# Altium footprint library Package_DFN_QFN.PcbLib: 557 footprints (part 33 of 35)
Each footprint in its own frame and in the unit in brackets; x right, y up, seen from the top. Pads: shape width x height; smd on the part's side, far side on the other; paste and mask are expansions set on the pad; w line width, h text height; cw(c..) or ccw(c..) is an arc to the next point about the centre after c.
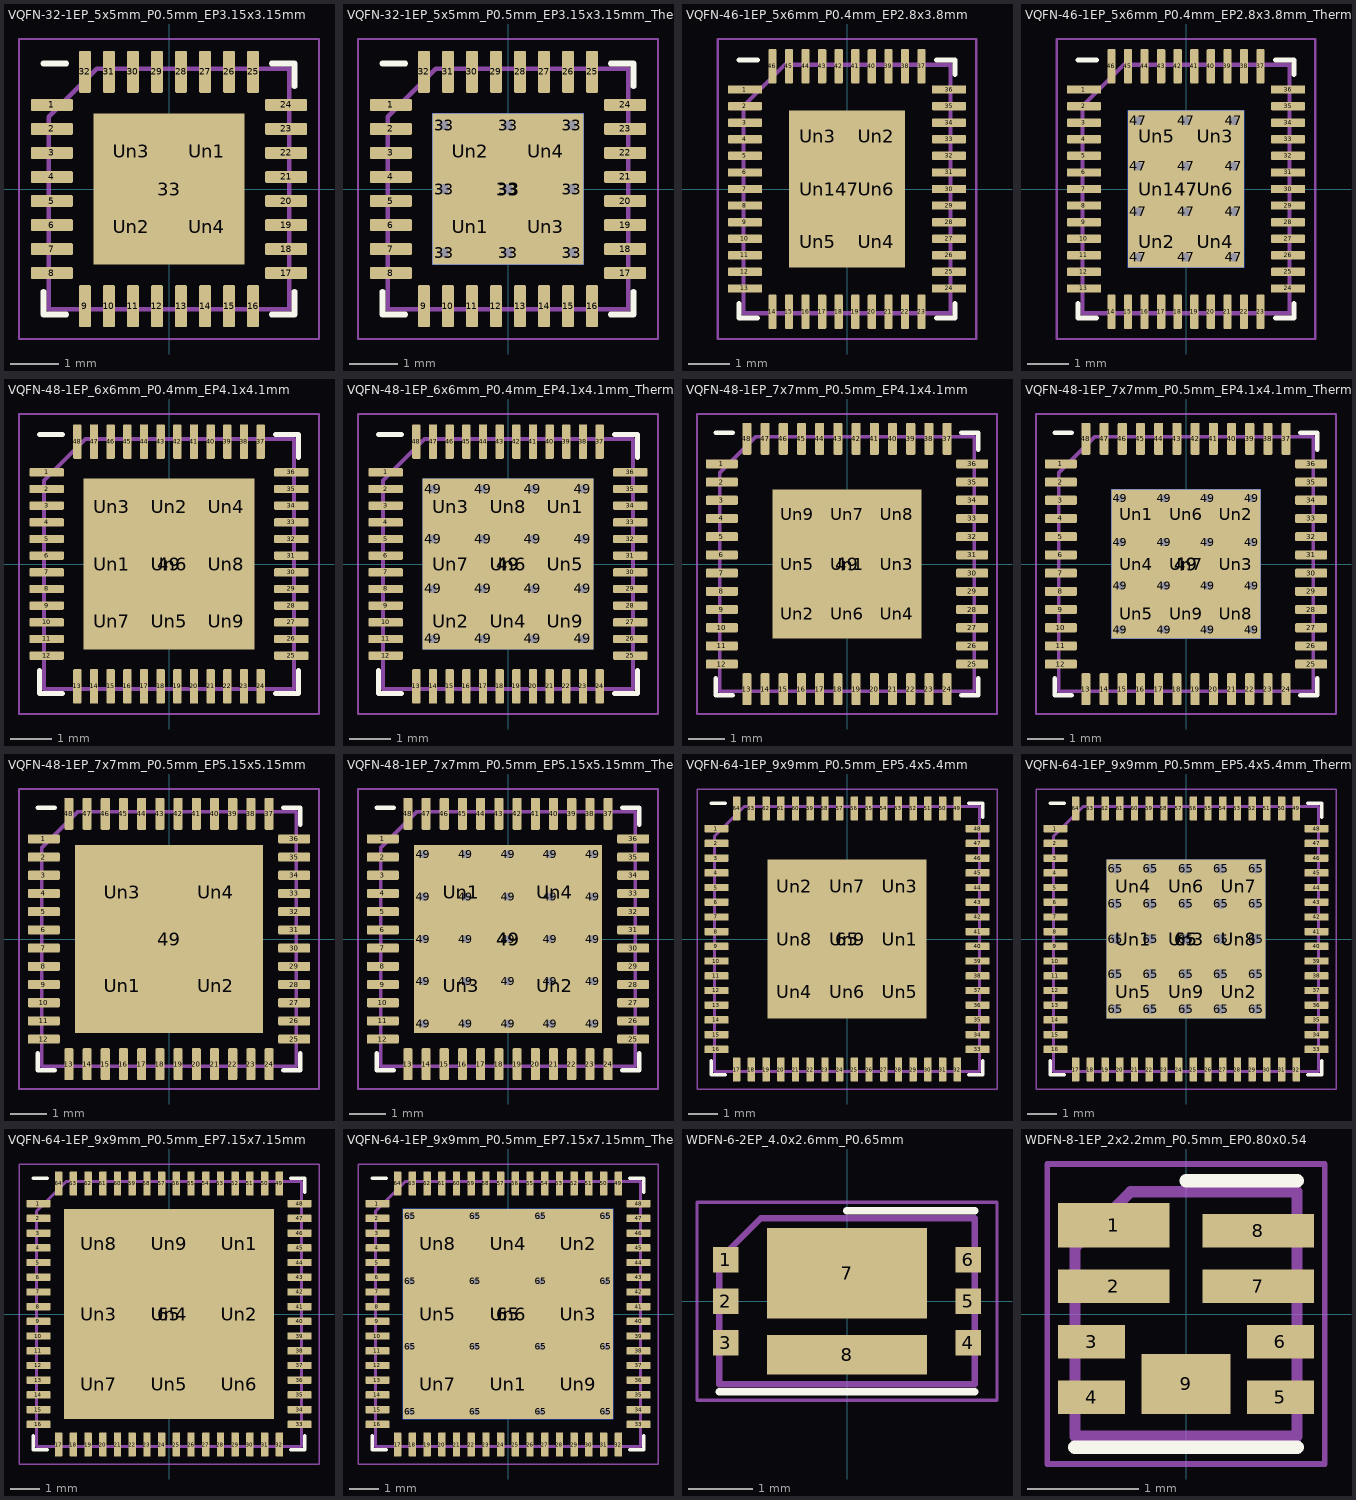
[diagram p32: the footprints below, top view; thin cyan lines are the x and y axes]

## VQFN-32-1EP_5x5mm_P0.5mm_EP3.15x3.15mm [mm]
pads (37):
  rrect25% 0.875x0.25 smd: 1(-2.438,1.75) 2(-2.438,1.25) 3(-2.438,0.75) 4(-2.438,0.25) 5(-2.438,-0.25) 6(-2.438,-0.75) 7(-2.438,-1.25) 8(-2.438,-1.75) 17(2.438,-1.75) 18(2.438,-1.25) 19(2.438,-0.75) 20(2.438,-0.25) 21(2.438,0.25) 22(2.438,0.75) 23(2.438,1.25) 24(2.438,1.75)
  rrect25% 0.25x0.875 smd: 9(-1.75,-2.438) 10(-1.25,-2.438) 11(-0.75,-2.438) 12(-0.25,-2.438) 13(0.25,-2.438) 14(0.75,-2.438) 15(1.25,-2.438) 16(1.75,-2.438) 25(1.75,2.438) 26(1.25,2.438) 27(0.75,2.438) 28(0.25,2.438) 29(-0.25,2.438) 30(-0.75,2.438) 31(-1.25,2.438) 32(-1.75,2.438)
  rect 3.15x3.15 smd: 33(0,0)
  rrect20% 1.27x1.27 on Top Paste: Un1(0.79,0.79) Un2(-0.79,-0.79) Un3(-0.79,0.79) Un4(0.79,-0.79)
F.SilkS:
  lines w0.12: -2.61,-2.135 -2.61,-2.61 -2.135,-2.61 ; -2.61,2.61 -2.135,2.61 ; 2.135,-2.61 2.61,-2.61 2.61,-2.135 ; 2.135,2.61 2.61,2.61 2.61,2.135
F.CrtYd:
  lines w0.05: -3.12,-3.12 -3.12,3.12 3.12,3.12 3.12,-3.12 -3.12,-3.12
F.Fab:
  lines w0.1: -2.5,-2.5 -2.5,1.5 -1.5,2.5 2.5,2.5 2.5,-2.5 -2.5,-2.5
  text "'.Designator'" at -4.047,-0.84 h1

## VQFN-32-1EP_5x5mm_P0.5mm_EP3.15x3.15mm_ThermalVias [mm]
pads (47):
  rrect25% 0.875x0.25 smd: 1(-2.438,1.75) 2(-2.438,1.25) 3(-2.438,0.75) 4(-2.438,0.25) 5(-2.438,-0.25) 6(-2.438,-0.75) 7(-2.438,-1.25) 8(-2.438,-1.75) 17(2.438,-1.75) 18(2.438,-1.25) 19(2.438,-0.75) 20(2.438,-0.25) 21(2.438,0.25) 22(2.438,0.75) 23(2.438,1.25) 24(2.438,1.75)
  rrect25% 0.25x0.875 smd: 9(-1.75,-2.438) 10(-1.25,-2.438) 11(-0.75,-2.438) 12(-0.25,-2.438) 13(0.25,-2.438) 14(0.75,-2.438) 15(1.25,-2.438) 16(1.75,-2.438) 25(1.75,2.438) 26(1.25,2.438) 27(0.75,2.438) 28(0.25,2.438) 29(-0.25,2.438) 30(-0.75,2.438) 31(-1.25,2.438) 32(-1.75,2.438)
  round 0.5 hole 0.2: 33(-1.325,-1.325) 33(-1.325,0) 33(-1.325,1.325) 33(0,-1.325) 33(0,0) 33(0,1.325) 33(1.325,-1.325) 33(1.325,0) 33(1.325,1.325)
  rect 3.15x3.15 smd far side: 33(0,0)
  rect 3.15x3.15 smd: 33(0,0)
  rrect20% 1.27x1.27 on Top Paste: Un1(-0.79,-0.79) Un2(-0.79,0.79) Un3(0.79,-0.79) Un4(0.79,0.79)
F.SilkS:
  lines w0.12: -2.61,-2.135 -2.61,-2.61 -2.135,-2.61 ; -2.61,2.61 -2.135,2.61 ; 2.135,-2.61 2.61,-2.61 2.61,-2.135 ; 2.135,2.61 2.61,2.61 2.61,2.135
F.CrtYd:
  lines w0.05: -3.12,-3.12 3.12,-3.12 3.12,3.12 -3.12,3.12 -3.12,-3.12
F.Fab:
  lines w0.1: -2.5,-2.5 -2.5,1.5 -1.5,2.5 2.5,2.5 2.5,-2.5 -2.5,-2.5
  text "'.Designator'" at -4.047,-0.84 h1

## VQFN-46-1EP_5x6mm_P0.4mm_EP2.8x3.8mm [mm]
pads (53):
  rrect25% 0.825x0.2 smd: 1(-2.462,2.4) 2(-2.462,2) 3(-2.462,1.6) 4(-2.462,1.2) 5(-2.462,0.8) 6(-2.462,0.4) 7(-2.462,0) 8(-2.462,-0.4) 9(-2.462,-0.8) 10(-2.462,-1.2) 11(-2.462,-1.6) 12(-2.462,-2) 13(-2.462,-2.4) 24(2.462,-2.4) 25(2.462,-2) 26(2.462,-1.6) 27(2.462,-1.2) 28(2.462,-0.8) 29(2.462,-0.4) 30(2.462,0) 31(2.462,0.4) 32(2.462,0.8) 33(2.462,1.2) 34(2.462,1.6) 35(2.462,2) 36(2.462,2.4)
  rrect25% 0.2x0.825 smd: 14(-1.8,-2.963) 15(-1.4,-2.963) 16(-1,-2.963) 17(-0.6,-2.963) 18(-0.2,-2.963) 19(0.2,-2.963) 20(0.6,-2.963) 21(1,-2.963) 22(1.4,-2.963) 23(1.8,-2.963) 37(1.8,2.963) 38(1.4,2.963) 39(1,2.963) 40(0.6,2.963) 41(0.2,2.963) 42(-0.2,2.963) 43(-0.6,2.963) 44(-1,2.963) 45(-1.4,2.963) 46(-1.8,2.963)
  rect 2.8x3.8 smd: 47(0,0)
  rrect25% 1.13x1.02 on Top Paste: Un1(-0.7,0) Un2(0.7,1.27) Un3(-0.7,1.27) Un4(0.7,-1.27) Un5(-0.7,-1.27) Un6(0.7,0)
F.SilkS:
  lines w0.12: -2.61,-2.76 -2.61,-3.11 -2.16,-3.11 ; -2.61,3.11 -2.16,3.11 ; 2.16,-3.11 2.61,-3.11 2.61,-2.76 ; 2.16,3.11 2.61,3.11 2.61,2.76
F.CrtYd:
  lines w0.05: -3.12,-3.62 3.12,-3.62 3.12,3.62 -3.12,3.62 -3.12,-3.62
F.Fab:
  lines w0.1: -2.5,-3 2.5,-3 2.5,3 -1.5,3 -2.5,2 -2.5,-3
  text "'.Designator'" at -4.047,-0.84 h1

## VQFN-46-1EP_5x6mm_P0.4mm_EP2.8x3.8mm_ThermalVias [mm]
pads (66):
  rrect25% 0.825x0.2 smd: 1(-2.462,2.4) 2(-2.462,2) 3(-2.462,1.6) 4(-2.462,1.2) 5(-2.462,0.8) 6(-2.462,0.4) 7(-2.462,0) 8(-2.462,-0.4) 9(-2.462,-0.8) 10(-2.462,-1.2) 11(-2.462,-1.6) 12(-2.462,-2) 13(-2.462,-2.4) 24(2.462,-2.4) 25(2.462,-2) 26(2.462,-1.6) 27(2.462,-1.2) 28(2.462,-0.8) 29(2.462,-0.4) 30(2.462,0) 31(2.462,0.4) 32(2.462,0.8) 33(2.462,1.2) 34(2.462,1.6) 35(2.462,2) 36(2.462,2.4)
  rrect25% 0.2x0.825 smd: 14(-1.8,-2.963) 15(-1.4,-2.963) 16(-1,-2.963) 17(-0.6,-2.963) 18(-0.2,-2.963) 19(0.2,-2.963) 20(0.6,-2.963) 21(1,-2.963) 22(1.4,-2.963) 23(1.8,-2.963) 37(1.8,2.963) 38(1.4,2.963) 39(1,2.963) 40(0.6,2.963) 41(0.2,2.963) 42(-0.2,2.963) 43(-0.6,2.963) 44(-1,2.963) 45(-1.4,2.963) 46(-1.8,2.963)
  round 0.5 hole 0.2: 47(-1.15,-1.65) 47(-1.15,-0.55) 47(-1.15,0.55) 47(-1.15,1.65) 47(0,-1.65) 47(0,-0.55) 47(0,0.55) 47(0,1.65) 47(1.15,-1.65) 47(1.15,-0.55) 47(1.15,0.55) 47(1.15,1.65)
  rect 2.8x3.8 smd: 47(0,0)
  rect 2.8x3.8 smd far side: 47(0,0)
  rrect23% 1.21x1.1 on Top Paste: Un1(-0.7,0) Un2(-0.7,-1.27) Un3(0.7,1.27) Un4(0.7,-1.27) Un5(-0.7,1.27) Un6(0.7,0)
F.SilkS:
  lines w0.12: -2.61,-2.76 -2.61,-3.11 -2.16,-3.11 ; -2.61,3.11 -2.16,3.11 ; 2.16,-3.11 2.61,-3.11 2.61,-2.76 ; 2.16,3.11 2.61,3.11 2.61,2.76
F.CrtYd:
  lines w0.05: -3.12,-3.62 3.12,-3.62 3.12,3.62 -3.12,3.62 -3.12,-3.62
F.Fab:
  lines w0.1: -2.5,-3 2.5,-3 2.5,3 -1.5,3 -2.5,2 -2.5,-3
  text "'.Designator'" at -4.047,-0.84 h1

## VQFN-48-1EP_6x6mm_P0.4mm_EP4.1x4.1mm [mm]
pads (58):
  rrect25% 0.825x0.2 smd: 1(-2.937,2.2) 2(-2.937,1.8) 3(-2.937,1.4) 4(-2.937,1) 5(-2.937,0.6) 6(-2.937,0.2) 7(-2.937,-0.2) 8(-2.937,-0.6) 9(-2.937,-1) 10(-2.937,-1.4) 11(-2.937,-1.8) 12(-2.937,-2.2) 25(2.937,-2.2) 26(2.937,-1.8) 27(2.937,-1.4) 28(2.937,-1) 29(2.937,-0.6) 30(2.937,-0.2) 31(2.937,0.2) 32(2.937,0.6) 33(2.937,1) 34(2.937,1.4) 35(2.937,1.8) 36(2.937,2.2)
  rrect25% 0.2x0.825 smd: 13(-2.2,-2.937) 14(-1.8,-2.937) 15(-1.4,-2.937) 16(-1,-2.937) 17(-0.6,-2.937) 18(-0.2,-2.937) 19(0.2,-2.937) 20(0.6,-2.937) 21(1,-2.937) 22(1.4,-2.937) 23(1.8,-2.937) 24(2.2,-2.937) 37(2.2,2.937) 38(1.8,2.937) 39(1.4,2.937) 40(1,2.937) 41(0.6,2.937) 42(0.2,2.937) 43(-0.2,2.937) 44(-0.6,2.937) 45(-1,2.937) 46(-1.4,2.937) 47(-1.8,2.937) 48(-2.2,2.937)
  rect 4.1x4.1 smd: 49(0,0)
  rrect23% 1.1x1.1 on Top Paste: Un1(-1.37,0) Un2(0,1.37) Un3(-1.37,1.37) Un4(1.37,1.37) Un5(0,-1.37) Un6(0,0) Un7(-1.37,-1.37) Un8(1.37,0) Un9(1.37,-1.37)
F.SilkS:
  lines w0.12: -3.11,-2.56 -3.11,-3.11 -2.56,-3.11 ; -3.11,3.11 -2.56,3.11 ; 2.56,-3.11 3.11,-3.11 3.11,-2.56 ; 2.56,3.11 3.11,3.11 3.11,2.56
F.CrtYd:
  lines w0.05: -3.6,-3.6 -3.6,3.6 3.6,3.6 3.6,-3.6 -3.6,-3.6
F.Fab:
  lines w0.1: -3,-3 3,-3 3,3 -2,3 -3,2 -3,-3
  text "'.Designator'" at -4.047,-0.84 h1

## VQFN-48-1EP_6x6mm_P0.4mm_EP4.1x4.1mm_ThermalVias [mm]
pads (75):
  rrect25% 0.825x0.2 smd: 1(-2.937,2.2) 2(-2.937,1.8) 3(-2.937,1.4) 4(-2.937,1) 5(-2.937,0.6) 6(-2.937,0.2) 7(-2.937,-0.2) 8(-2.937,-0.6) 9(-2.937,-1) 10(-2.937,-1.4) 11(-2.937,-1.8) 12(-2.937,-2.2) 25(2.937,-2.2) 26(2.937,-1.8) 27(2.937,-1.4) 28(2.937,-1) 29(2.937,-0.6) 30(2.937,-0.2) 31(2.937,0.2) 32(2.937,0.6) 33(2.937,1) 34(2.937,1.4) 35(2.937,1.8) 36(2.937,2.2)
  rrect25% 0.2x0.825 smd: 13(-2.2,-2.937) 14(-1.8,-2.937) 15(-1.4,-2.937) 16(-1,-2.937) 17(-0.6,-2.937) 18(-0.2,-2.937) 19(0.2,-2.937) 20(0.6,-2.937) 21(1,-2.937) 22(1.4,-2.937) 23(1.8,-2.937) 24(2.2,-2.937) 37(2.2,2.937) 38(1.8,2.937) 39(1.4,2.937) 40(1,2.937) 41(0.6,2.937) 42(0.2,2.937) 43(-0.2,2.937) 44(-0.6,2.937) 45(-1,2.937) 46(-1.4,2.937) 47(-1.8,2.937) 48(-2.2,2.937)
  round 0.5 hole 0.2: 49(-1.8,-1.8) 49(-1.8,-0.6) 49(-1.8,0.6) 49(-1.8,1.8) 49(-0.6,-1.8) 49(-0.6,-0.6) 49(-0.6,0.6) 49(-0.6,1.8) 49(0.6,-1.8) 49(0.6,-0.6) 49(0.6,0.6) 49(0.6,1.8) 49(1.8,-1.8) 49(1.8,-0.6) 49(1.8,0.6) 49(1.8,1.8)
  rect 4.1x4.1 smd: 49(0,0)
  rect 4.1x4.1 smd far side: 49(0,0)
  rrect23% 1.1x1.1 on Top Paste: Un1(1.37,1.37) Un2(-1.37,-1.37) Un3(-1.37,1.37) Un4(0,-1.37) Un5(1.37,0) Un6(0,0) Un7(-1.37,0) Un8(0,1.37) Un9(1.37,-1.37)
F.SilkS:
  lines w0.12: -3.11,-2.56 -3.11,-3.11 -2.56,-3.11 ; -3.11,3.11 -2.56,3.11 ; 2.56,-3.11 3.11,-3.11 3.11,-2.56 ; 2.56,3.11 3.11,3.11 3.11,2.56
F.CrtYd:
  lines w0.05: -3.6,-3.6 -3.6,3.6 3.6,3.6 3.6,-3.6 -3.6,-3.6
F.Fab:
  lines w0.1: -3,-3 3,-3 3,3 -2,3 -3,2 -3,-3
  text "'.Designator'" at -4.047,-0.84 h1

## VQFN-48-1EP_7x7mm_P0.5mm_EP4.1x4.1mm [mm]
pads (58):
  rrect25% 0.875x0.25 smd: 1(-3.437,2.75) 2(-3.437,2.25) 3(-3.437,1.75) 4(-3.437,1.25) 5(-3.437,0.75) 6(-3.437,0.25) 7(-3.437,-0.25) 8(-3.437,-0.75) 9(-3.437,-1.25) 10(-3.437,-1.75) 11(-3.437,-2.25) 12(-3.437,-2.75) 25(3.437,-2.75) 26(3.437,-2.25) 27(3.437,-1.75) 28(3.437,-1.25) 29(3.437,-0.75) 30(3.437,-0.25) 31(3.437,0.25) 32(3.437,0.75) 33(3.437,1.25) 34(3.437,1.75) 35(3.437,2.25) 36(3.437,2.75)
  rrect25% 0.25x0.875 smd: 13(-2.75,-3.437) 14(-2.25,-3.437) 15(-1.75,-3.437) 16(-1.25,-3.437) 17(-0.75,-3.437) 18(-0.25,-3.437) 19(0.25,-3.437) 20(0.75,-3.437) 21(1.25,-3.437) 22(1.75,-3.437) 23(2.25,-3.437) 24(2.75,-3.437) 37(2.75,3.437) 38(2.25,3.437) 39(1.75,3.437) 40(1.25,3.437) 41(0.75,3.437) 42(0.25,3.437) 43(-0.25,3.437) 44(-0.75,3.437) 45(-1.25,3.437) 46(-1.75,3.437) 47(-2.25,3.437) 48(-2.75,3.437)
  rect 4.1x4.1 smd: 49(0,0)
  rrect23% 1.1x1.1 on Top Paste: Un1(0,0) Un2(-1.37,-1.37) Un3(1.37,0) Un4(1.37,-1.37) Un5(-1.37,0) Un6(0,-1.37) Un7(0,1.37) Un8(1.37,1.37) Un9(-1.37,1.37)
F.SilkS:
  lines w0.12: -3.61,-3.135 -3.61,-3.61 -3.135,-3.61 ; -3.61,3.61 -3.135,3.61 ; 3.135,-3.61 3.61,-3.61 3.61,-3.135 ; 3.135,3.61 3.61,3.61 3.61,3.135
F.CrtYd:
  lines w0.05: -4.12,-4.12 -4.12,4.12 4.12,4.12 4.12,-4.12 -4.12,-4.12
F.Fab:
  lines w0.1: -3.5,-3.5 -3.5,2.5 -2.5,3.5 3.5,3.5 3.5,-3.5 -3.5,-3.5
  text "'.Designator'" at -4.047,-0.84 h1

## VQFN-48-1EP_7x7mm_P0.5mm_EP4.1x4.1mm_ThermalVias [mm]
pads (75):
  rrect25% 0.875x0.25 smd: 1(-3.437,2.75) 2(-3.437,2.25) 3(-3.437,1.75) 4(-3.437,1.25) 5(-3.437,0.75) 6(-3.437,0.25) 7(-3.437,-0.25) 8(-3.437,-0.75) 9(-3.437,-1.25) 10(-3.437,-1.75) 11(-3.437,-2.25) 12(-3.437,-2.75) 25(3.437,-2.75) 26(3.437,-2.25) 27(3.437,-1.75) 28(3.437,-1.25) 29(3.437,-0.75) 30(3.437,-0.25) 31(3.437,0.25) 32(3.437,0.75) 33(3.437,1.25) 34(3.437,1.75) 35(3.437,2.25) 36(3.437,2.75)
  rrect25% 0.25x0.875 smd: 13(-2.75,-3.437) 14(-2.25,-3.437) 15(-1.75,-3.437) 16(-1.25,-3.437) 17(-0.75,-3.437) 18(-0.25,-3.437) 19(0.25,-3.437) 20(0.75,-3.437) 21(1.25,-3.437) 22(1.75,-3.437) 23(2.25,-3.437) 24(2.75,-3.437) 37(2.75,3.437) 38(2.25,3.437) 39(1.75,3.437) 40(1.25,3.437) 41(0.75,3.437) 42(0.25,3.437) 43(-0.25,3.437) 44(-0.75,3.437) 45(-1.25,3.437) 46(-1.75,3.437) 47(-2.25,3.437) 48(-2.75,3.437)
  round 0.5 hole 0.2: 49(-1.8,-1.8) 49(-1.8,-0.6) 49(-1.8,0.6) 49(-1.8,1.8) 49(-0.6,-1.8) 49(-0.6,-0.6) 49(-0.6,0.6) 49(-0.6,1.8) 49(0.6,-1.8) 49(0.6,-0.6) 49(0.6,0.6) 49(0.6,1.8) 49(1.8,-1.8) 49(1.8,-0.6) 49(1.8,0.6) 49(1.8,1.8)
  rect 4.1x4.1 smd: 49(0,0)
  rect 4.1x4.1 smd far side: 49(0,0)
  rrect23% 1.1x1.1 on Top Paste: Un1(-1.37,1.37) Un2(1.37,1.37) Un3(1.37,0) Un4(-1.37,0) Un5(-1.37,-1.37) Un6(0,1.37) Un7(0,0) Un8(1.37,-1.37) Un9(0,-1.37)
F.SilkS:
  lines w0.12: -3.61,-3.135 -3.61,-3.61 -3.135,-3.61 ; -3.61,3.61 -3.135,3.61 ; 3.135,-3.61 3.61,-3.61 3.61,-3.135 ; 3.135,3.61 3.61,3.61 3.61,3.135
F.CrtYd:
  lines w0.05: -4.12,-4.12 4.12,-4.12 4.12,4.12 -4.12,4.12 -4.12,-4.12
F.Fab:
  lines w0.1: -3.5,-3.5 3.5,-3.5 3.5,3.5 -2.5,3.5 -3.5,2.5 -3.5,-3.5
  text "'.Designator'" at -4.047,-0.84 h1

## VQFN-48-1EP_7x7mm_P0.5mm_EP5.15x5.15mm [mm]
pads (53):
  rrect25% 0.875x0.25 smd: 1(-3.437,2.75) 2(-3.437,2.25) 3(-3.437,1.75) 4(-3.437,1.25) 5(-3.437,0.75) 6(-3.437,0.25) 7(-3.437,-0.25) 8(-3.437,-0.75) 9(-3.437,-1.25) 10(-3.437,-1.75) 11(-3.437,-2.25) 12(-3.437,-2.75) 25(3.437,-2.75) 26(3.437,-2.25) 27(3.437,-1.75) 28(3.437,-1.25) 29(3.437,-0.75) 30(3.437,-0.25) 31(3.437,0.25) 32(3.437,0.75) 33(3.437,1.25) 34(3.437,1.75) 35(3.437,2.25) 36(3.437,2.75)
  rrect25% 0.25x0.875 smd: 13(-2.75,-3.437) 14(-2.25,-3.437) 15(-1.75,-3.437) 16(-1.25,-3.437) 17(-0.75,-3.437) 18(-0.25,-3.437) 19(0.25,-3.437) 20(0.75,-3.437) 21(1.25,-3.437) 22(1.75,-3.437) 23(2.25,-3.437) 24(2.75,-3.437) 37(2.75,3.437) 38(2.25,3.437) 39(1.75,3.437) 40(1.25,3.437) 41(0.75,3.437) 42(0.25,3.437) 43(-0.25,3.437) 44(-0.75,3.437) 45(-1.25,3.437) 46(-1.75,3.437) 47(-2.25,3.437) 48(-2.75,3.437)
  rect 5.15x5.15 smd: 49(0,0)
  rrect12% 2.08x2.08 on Top Paste: Un1(-1.29,-1.29) Un2(1.29,-1.29) Un3(-1.29,1.29) Un4(1.29,1.29)
F.SilkS:
  lines w0.12: -3.61,-3.135 -3.61,-3.61 -3.135,-3.61 ; -3.61,3.61 -3.135,3.61 ; 3.135,-3.61 3.61,-3.61 3.61,-3.135 ; 3.135,3.61 3.61,3.61 3.61,3.135
F.CrtYd:
  lines w0.05: -4.12,-4.12 -4.12,4.12 4.12,4.12 4.12,-4.12 -4.12,-4.12
F.Fab:
  lines w0.1: -3.5,-3.5 3.5,-3.5 3.5,3.5 -2.5,3.5 -3.5,2.5 -3.5,-3.5
  text "'.Designator'" at -4.047,-0.84 h1

## VQFN-48-1EP_7x7mm_P0.5mm_EP5.15x5.15mm_ThermalVias [mm]
pads (79):
  rrect25% 0.875x0.25 smd: 1(-3.437,2.75) 2(-3.437,2.25) 3(-3.437,1.75) 4(-3.437,1.25) 5(-3.437,0.75) 6(-3.437,0.25) 7(-3.437,-0.25) 8(-3.437,-0.75) 9(-3.437,-1.25) 10(-3.437,-1.75) 11(-3.437,-2.25) 12(-3.437,-2.75) 25(3.437,-2.75) 26(3.437,-2.25) 27(3.437,-1.75) 28(3.437,-1.25) 29(3.437,-0.75) 30(3.437,-0.25) 31(3.437,0.25) 32(3.437,0.75) 33(3.437,1.25) 34(3.437,1.75) 35(3.437,2.25) 36(3.437,2.75)
  rrect25% 0.25x0.875 smd: 13(-2.75,-3.437) 14(-2.25,-3.437) 15(-1.75,-3.437) 16(-1.25,-3.437) 17(-0.75,-3.437) 18(-0.25,-3.437) 19(0.25,-3.437) 20(0.75,-3.437) 21(1.25,-3.437) 22(1.75,-3.437) 23(2.25,-3.437) 24(2.75,-3.437) 37(2.75,3.437) 38(2.25,3.437) 39(1.75,3.437) 40(1.25,3.437) 41(0.75,3.437) 42(0.25,3.437) 43(-0.25,3.437) 44(-0.75,3.437) 45(-1.25,3.437) 46(-1.75,3.437) 47(-2.25,3.437) 48(-2.75,3.437)
  round 0.5 hole 0.2: 49(-2.325,-2.325) 49(-2.325,-1.162) 49(-2.325,0) 49(-2.325,1.162) 49(-2.325,2.325) 49(-1.162,-2.325) 49(-1.162,-1.162) 49(-1.162,0) 49(-1.162,1.162) 49(-1.162,2.325) 49(0,-2.325) 49(0,-1.162) 49(0,0) 49(0,1.162) 49(0,2.325) 49(1.162,-2.325) 49(1.162,-1.162) 49(1.162,0) 49(1.162,1.162) 49(1.162,2.325) 49(2.325,-2.325) 49(2.325,-1.162) 49(2.325,0) 49(2.325,1.162) 49(2.325,2.325)
  rect 5.15x5.15 smd far side: 49(0,0)
  rect 5.15x5.15 smd: 49(0,0)
  rrect12% 2.08x2.08 on Top Paste: Un1(-1.29,1.29) Un2(1.29,-1.29) Un3(-1.29,-1.29) Un4(1.29,1.29)
F.SilkS:
  lines w0.12: -3.61,-3.135 -3.61,-3.61 -3.135,-3.61 ; -3.61,3.61 -3.135,3.61 ; 3.135,-3.61 3.61,-3.61 3.61,-3.135 ; 3.135,3.61 3.61,3.61 3.61,3.135
F.CrtYd:
  lines w0.05: -4.12,-4.12 4.12,-4.12 4.12,4.12 -4.12,4.12 -4.12,-4.12
F.Fab:
  lines w0.1: -3.5,-3.5 -3.5,2.5 -2.5,3.5 3.5,3.5 3.5,-3.5 -3.5,-3.5
  text "'.Designator'" at -4.047,-0.84 h1

## VQFN-64-1EP_9x9mm_P0.5mm_EP5.4x5.4mm [mm]
pads (74):
  rrect25% 0.825x0.25 smd: 1(-4.437,3.75) 2(-4.437,3.25) 3(-4.437,2.75) 4(-4.437,2.25) 5(-4.437,1.75) 6(-4.437,1.25) 7(-4.437,0.75) 8(-4.437,0.25) 9(-4.437,-0.25) 10(-4.437,-0.75) 11(-4.437,-1.25) 12(-4.437,-1.75) 13(-4.437,-2.25) 14(-4.437,-2.75) 15(-4.437,-3.25) 16(-4.437,-3.75) 33(4.437,-3.75) 34(4.437,-3.25) 35(4.437,-2.75) 36(4.437,-2.25) 37(4.437,-1.75) 38(4.437,-1.25) 39(4.437,-0.75) 40(4.437,-0.25) 41(4.437,0.25) 42(4.437,0.75) 43(4.437,1.25) 44(4.437,1.75) 45(4.437,2.25) 46(4.437,2.75) 47(4.437,3.25) 48(4.437,3.75)
  rrect25% 0.25x0.825 smd: 17(-3.75,-4.437) 18(-3.25,-4.437) 19(-2.75,-4.437) 20(-2.25,-4.437) 21(-1.75,-4.437) 22(-1.25,-4.437) 23(-0.75,-4.437) 24(-0.25,-4.437) 25(0.25,-4.437) 26(0.75,-4.437) 27(1.25,-4.437) 28(1.75,-4.437) 29(2.25,-4.437) 30(2.75,-4.437) 31(3.25,-4.437) 32(3.75,-4.437) 49(3.75,4.437) 50(3.25,4.437) 51(2.75,4.437) 52(2.25,4.437) 53(1.75,4.437) 54(1.25,4.437) 55(0.75,4.437) 56(0.25,4.437) 57(-0.25,4.437) 58(-0.75,4.437) 59(-1.25,4.437) 60(-1.75,4.437) 61(-2.25,4.437) 62(-2.75,4.437) 63(-3.25,4.437) 64(-3.75,4.437)
  rect 5.4x5.4 smd: 65(0,0)
  rrect17% 1.45x1.45 on Top Paste: Un1(1.8,0) Un2(-1.8,1.8) Un3(1.8,1.8) Un4(-1.8,-1.8) Un5(1.8,-1.8) Un6(0,-1.8) Un7(0,1.8) Un8(-1.8,0) Un9(0,0)
F.SilkS:
  lines w0.12: -4.61,-4.135 -4.61,-4.61 -4.135,-4.61 ; -4.61,4.61 -4.135,4.61 ; 4.135,-4.61 4.61,-4.61 4.61,-4.135 ; 4.135,4.61 4.61,4.61 4.61,4.135
F.CrtYd:
  lines w0.05: -5.1,-5.1 5.1,-5.1 5.1,5.1 -5.1,5.1 -5.1,-5.1
F.Fab:
  lines w0.1: -4.5,-4.5 4.5,-4.5 4.5,4.5 -3.5,4.5 -4.5,3.5 -4.5,-4.5
  text "'.Designator'" at -4.047,-0.84 h1

## VQFN-64-1EP_9x9mm_P0.5mm_EP5.4x5.4mm_ThermalVias [mm]
pads (100):
  rrect25% 0.825x0.25 smd: 1(-4.437,3.75) 2(-4.437,3.25) 3(-4.437,2.75) 4(-4.437,2.25) 5(-4.437,1.75) 6(-4.437,1.25) 7(-4.437,0.75) 8(-4.437,0.25) 9(-4.437,-0.25) 10(-4.437,-0.75) 11(-4.437,-1.25) 12(-4.437,-1.75) 13(-4.437,-2.25) 14(-4.437,-2.75) 15(-4.437,-3.25) 16(-4.437,-3.75) 33(4.437,-3.75) 34(4.437,-3.25) 35(4.437,-2.75) 36(4.437,-2.25) 37(4.437,-1.75) 38(4.437,-1.25) 39(4.437,-0.75) 40(4.437,-0.25) 41(4.437,0.25) 42(4.437,0.75) 43(4.437,1.25) 44(4.437,1.75) 45(4.437,2.25) 46(4.437,2.75) 47(4.437,3.25) 48(4.437,3.75)
  rrect25% 0.25x0.825 smd: 17(-3.75,-4.437) 18(-3.25,-4.437) 19(-2.75,-4.437) 20(-2.25,-4.437) 21(-1.75,-4.437) 22(-1.25,-4.437) 23(-0.75,-4.437) 24(-0.25,-4.437) 25(0.25,-4.437) 26(0.75,-4.437) 27(1.25,-4.437) 28(1.75,-4.437) 29(2.25,-4.437) 30(2.75,-4.437) 31(3.25,-4.437) 32(3.75,-4.437) 49(3.75,4.437) 50(3.25,4.437) 51(2.75,4.437) 52(2.25,4.437) 53(1.75,4.437) 54(1.25,4.437) 55(0.75,4.437) 56(0.25,4.437) 57(-0.25,4.437) 58(-0.75,4.437) 59(-1.25,4.437) 60(-1.75,4.437) 61(-2.25,4.437) 62(-2.75,4.437) 63(-3.25,4.437) 64(-3.75,4.437)
  round 0.63 hole 0.33: 65(-2.385,-2.385) 65(-2.385,-1.192) 65(-2.385,0) 65(-2.385,1.192) 65(-2.385,2.385) 65(-1.192,-2.385) 65(-1.192,-1.192) 65(-1.192,0) 65(-1.192,1.192) 65(-1.192,2.385) 65(0,-2.385) 65(0,-1.192) 65(0,0) 65(0,1.192) 65(0,2.385) 65(1.192,-2.385) 65(1.192,-1.192) 65(1.192,0) 65(1.192,1.192) 65(1.192,2.385) 65(2.385,-2.385) 65(2.385,-1.192) 65(2.385,0) 65(2.385,1.192) 65(2.385,2.385)
  rect 5.4x5.4 smd far side: 65(0,0)
  rect 5.4x5.4 smd: 65(0,0)
  rrect17% 1.45x1.45 on Top Paste: Un1(-1.8,0) Un2(1.8,-1.8) Un3(0,0) Un4(-1.8,1.8) Un5(-1.8,-1.8) Un6(0,1.8) Un7(1.8,1.8) Un8(1.8,0) Un9(0,-1.8)
F.SilkS:
  lines w0.12: -4.61,-4.135 -4.61,-4.61 -4.135,-4.61 ; -4.61,4.61 -4.135,4.61 ; 4.135,-4.61 4.61,-4.61 4.61,-4.135 ; 4.135,4.61 4.61,4.61 4.61,4.135
F.CrtYd:
  lines w0.05: -5.1,-5.1 -5.1,5.1 5.1,5.1 5.1,-5.1 -5.1,-5.1
F.Fab:
  lines w0.1: -4.5,-4.5 4.5,-4.5 4.5,4.5 -3.5,4.5 -4.5,3.5 -4.5,-4.5
  text "'.Designator'" at -4.047,-0.84 h1

## VQFN-64-1EP_9x9mm_P0.5mm_EP7.15x7.15mm [mm]
pads (74):
  rrect25% 0.825x0.25 smd: 1(-4.437,3.75) 2(-4.437,3.25) 3(-4.437,2.75) 4(-4.437,2.25) 5(-4.437,1.75) 6(-4.437,1.25) 7(-4.437,0.75) 8(-4.437,0.25) 9(-4.437,-0.25) 10(-4.437,-0.75) 11(-4.437,-1.25) 12(-4.437,-1.75) 13(-4.437,-2.25) 14(-4.437,-2.75) 15(-4.437,-3.25) 16(-4.437,-3.75) 33(4.437,-3.75) 34(4.437,-3.25) 35(4.437,-2.75) 36(4.437,-2.25) 37(4.437,-1.75) 38(4.437,-1.25) 39(4.437,-0.75) 40(4.437,-0.25) 41(4.437,0.25) 42(4.437,0.75) 43(4.437,1.25) 44(4.437,1.75) 45(4.437,2.25) 46(4.437,2.75) 47(4.437,3.25) 48(4.437,3.75)
  rrect25% 0.25x0.825 smd: 17(-3.75,-4.437) 18(-3.25,-4.437) 19(-2.75,-4.437) 20(-2.25,-4.437) 21(-1.75,-4.437) 22(-1.25,-4.437) 23(-0.75,-4.437) 24(-0.25,-4.437) 25(0.25,-4.437) 26(0.75,-4.437) 27(1.25,-4.437) 28(1.75,-4.437) 29(2.25,-4.437) 30(2.75,-4.437) 31(3.25,-4.437) 32(3.75,-4.437) 49(3.75,4.437) 50(3.25,4.437) 51(2.75,4.437) 52(2.25,4.437) 53(1.75,4.437) 54(1.25,4.437) 55(0.75,4.437) 56(0.25,4.437) 57(-0.25,4.437) 58(-0.75,4.437) 59(-1.25,4.437) 60(-1.75,4.437) 61(-2.25,4.437) 62(-2.75,4.437) 63(-3.25,4.437) 64(-3.75,4.437)
  rect 7.15x7.15 smd: 65(0,0)
  rrect13% 1.92x1.92 on Top Paste: Un1(2.38,2.38) Un2(2.38,0) Un3(-2.38,0) Un4(0,0) Un5(0,-2.38) Un6(2.38,-2.38) Un7(-2.38,-2.38) Un8(-2.38,2.38) Un9(0,2.38)
F.SilkS:
  lines w0.12: -4.61,-4.135 -4.61,-4.61 -4.135,-4.61 ; -4.61,4.61 -4.135,4.61 ; 4.135,-4.61 4.61,-4.61 4.61,-4.135 ; 4.135,4.61 4.61,4.61 4.61,4.135
F.CrtYd:
  lines w0.05: -5.1,-5.1 -5.1,5.1 5.1,5.1 5.1,-5.1 -5.1,-5.1
F.Fab:
  lines w0.1: -4.5,-4.5 4.5,-4.5 4.5,4.5 -3.5,4.5 -4.5,3.5 -4.5,-4.5
  text "'.Designator'" at -4.047,-0.84 h1

## VQFN-64-1EP_9x9mm_P0.5mm_EP7.15x7.15mm_ThermalVias [mm]
pads (91):
  rrect25% 0.825x0.25 smd: 1(-4.437,3.75) 2(-4.437,3.25) 3(-4.437,2.75) 4(-4.437,2.25) 5(-4.437,1.75) 6(-4.437,1.25) 7(-4.437,0.75) 8(-4.437,0.25) 9(-4.437,-0.25) 10(-4.437,-0.75) 11(-4.437,-1.25) 12(-4.437,-1.75) 13(-4.437,-2.25) 14(-4.437,-2.75) 15(-4.437,-3.25) 16(-4.437,-3.75) 33(4.437,-3.75) 34(4.437,-3.25) 35(4.437,-2.75) 36(4.437,-2.25) 37(4.437,-1.75) 38(4.437,-1.25) 39(4.437,-0.75) 40(4.437,-0.25) 41(4.437,0.25) 42(4.437,0.75) 43(4.437,1.25) 44(4.437,1.75) 45(4.437,2.25) 46(4.437,2.75) 47(4.437,3.25) 48(4.437,3.75)
  rrect25% 0.25x0.825 smd: 17(-3.75,-4.437) 18(-3.25,-4.437) 19(-2.75,-4.437) 20(-2.25,-4.437) 21(-1.75,-4.437) 22(-1.25,-4.437) 23(-0.75,-4.437) 24(-0.25,-4.437) 25(0.25,-4.437) 26(0.75,-4.437) 27(1.25,-4.437) 28(1.75,-4.437) 29(2.25,-4.437) 30(2.75,-4.437) 31(3.25,-4.437) 32(3.75,-4.437) 49(3.75,4.437) 50(3.25,4.437) 51(2.75,4.437) 52(2.25,4.437) 53(1.75,4.437) 54(1.25,4.437) 55(0.75,4.437) 56(0.25,4.437) 57(-0.25,4.437) 58(-0.75,4.437) 59(-1.25,4.437) 60(-1.75,4.437) 61(-2.25,4.437) 62(-2.75,4.437) 63(-3.25,4.437) 64(-3.75,4.437)
  round 0.5 hole 0.2: 65(-3.325,-3.325) 65(-3.325,-1.108) 65(-3.325,1.108) 65(-3.325,3.325) 65(-1.108,-3.325) 65(-1.108,-1.108) 65(-1.108,1.108) 65(-1.108,3.325) 65(1.108,-3.325) 65(1.108,-1.108) 65(1.108,1.108) 65(1.108,3.325) 65(3.325,-3.325) 65(3.325,-1.108) 65(3.325,1.108) 65(3.325,3.325)
  rect 7.15x7.15 smd: 65(0,0)
  rect 7.15x7.15 smd far side: 65(0,0)
  rrect13% 1.92x1.92 on Top Paste: Un1(0,-2.38) Un2(2.38,2.38) Un3(2.38,0) Un4(0,2.38) Un5(-2.38,0) Un6(0,0) Un7(-2.38,-2.38) Un8(-2.38,2.38) Un9(2.38,-2.38)
F.SilkS:
  lines w0.12: -4.61,-4.135 -4.61,-4.61 -4.135,-4.61 ; -4.61,4.61 -4.135,4.61 ; 4.135,-4.61 4.61,-4.61 4.61,-4.135 ; 4.135,4.61 4.61,4.61 4.61,4.135
F.CrtYd:
  lines w0.05: -5.1,-5.1 -5.1,5.1 5.1,5.1 5.1,-5.1 -5.1,-5.1
F.Fab:
  lines w0.1: -4.5,-4.5 4.5,-4.5 4.5,4.5 -3.5,4.5 -4.5,3.5 -4.5,-4.5
  text "'.Designator'" at -4.047,-0.84 h1

## WDFN-6-2EP_4.0x2.6mm_P0.65mm [mm]
pads (8):
  rect 0.4x0.4 smd: 1(-1.9,0.65) 2(-1.9,0) 3(-1.9,-0.65) 4(1.9,-0.65) 5(1.9,0) 6(1.9,0.65)
  rect 2.5x1.415 smd: 7(0,0.438)
  rect 2.5x0.615 smd: 8(0,-0.838)
F.SilkS:
  lines w0.12: -2,-1.42 2,-1.42 ; 0,1.42 2,1.42
F.CrtYd:
  lines w0.05: -2.35,-1.55 2.35,-1.55 2.35,1.55 -2.35,1.55 -2.35,-1.55
F.Fab:
  lines w0.1: -2,-1.3 2,-1.3 2,1.3 -1.35,1.3 -2,0.65 -2,-1.3
  text "'.Designator'" at -3.237,-0.672 h0.8

## WDFN-8-1EP_2x2.2mm_P0.5mm_EP0.80x0.54 [mm]
pads (9):
  rect 1x0.4 smd: 1(-0.65,0.8)
  rect 1x0.3 smd: 2(-0.65,0.25) 7(0.65,0.25) 8(0.65,0.75)
  rect 0.6x0.3 smd: 3(-0.85,-0.25) 4(-0.85,-0.75) 5(0.85,-0.75) 6(0.85,-0.25)
  rect 0.8x0.54 smd: 9(0,-0.63)
F.SilkS:
  lines w0.12: -1,-1.2 1,-1.2 ; 0,1.2 1,1.2
F.CrtYd:
  lines w0.05: -1.25,-1.35 1.25,-1.35 1.25,1.35 -1.25,1.35 -1.25,-1.35
F.Fab:
  lines w0.1: -1,-1.1 1,-1.1 1,1.1 -0.5,1.1 -1,0.6 -1,-1.1
  text "'.Designator'" at -2.048,-0.445 h0.5